# Altium footprint library Generic Footprint.PcbLib: 160 footprints (part 3 of 20)
Each footprint in its own frame and in the unit in brackets; x right, y up, seen from the top. Pads: shape width x height; smd on the part's side, far side on the other; paste and mask are expansions set on the pad; w line width, h text height; cw(c..) or ccw(c..) is an arc to the next point about the centre after c.
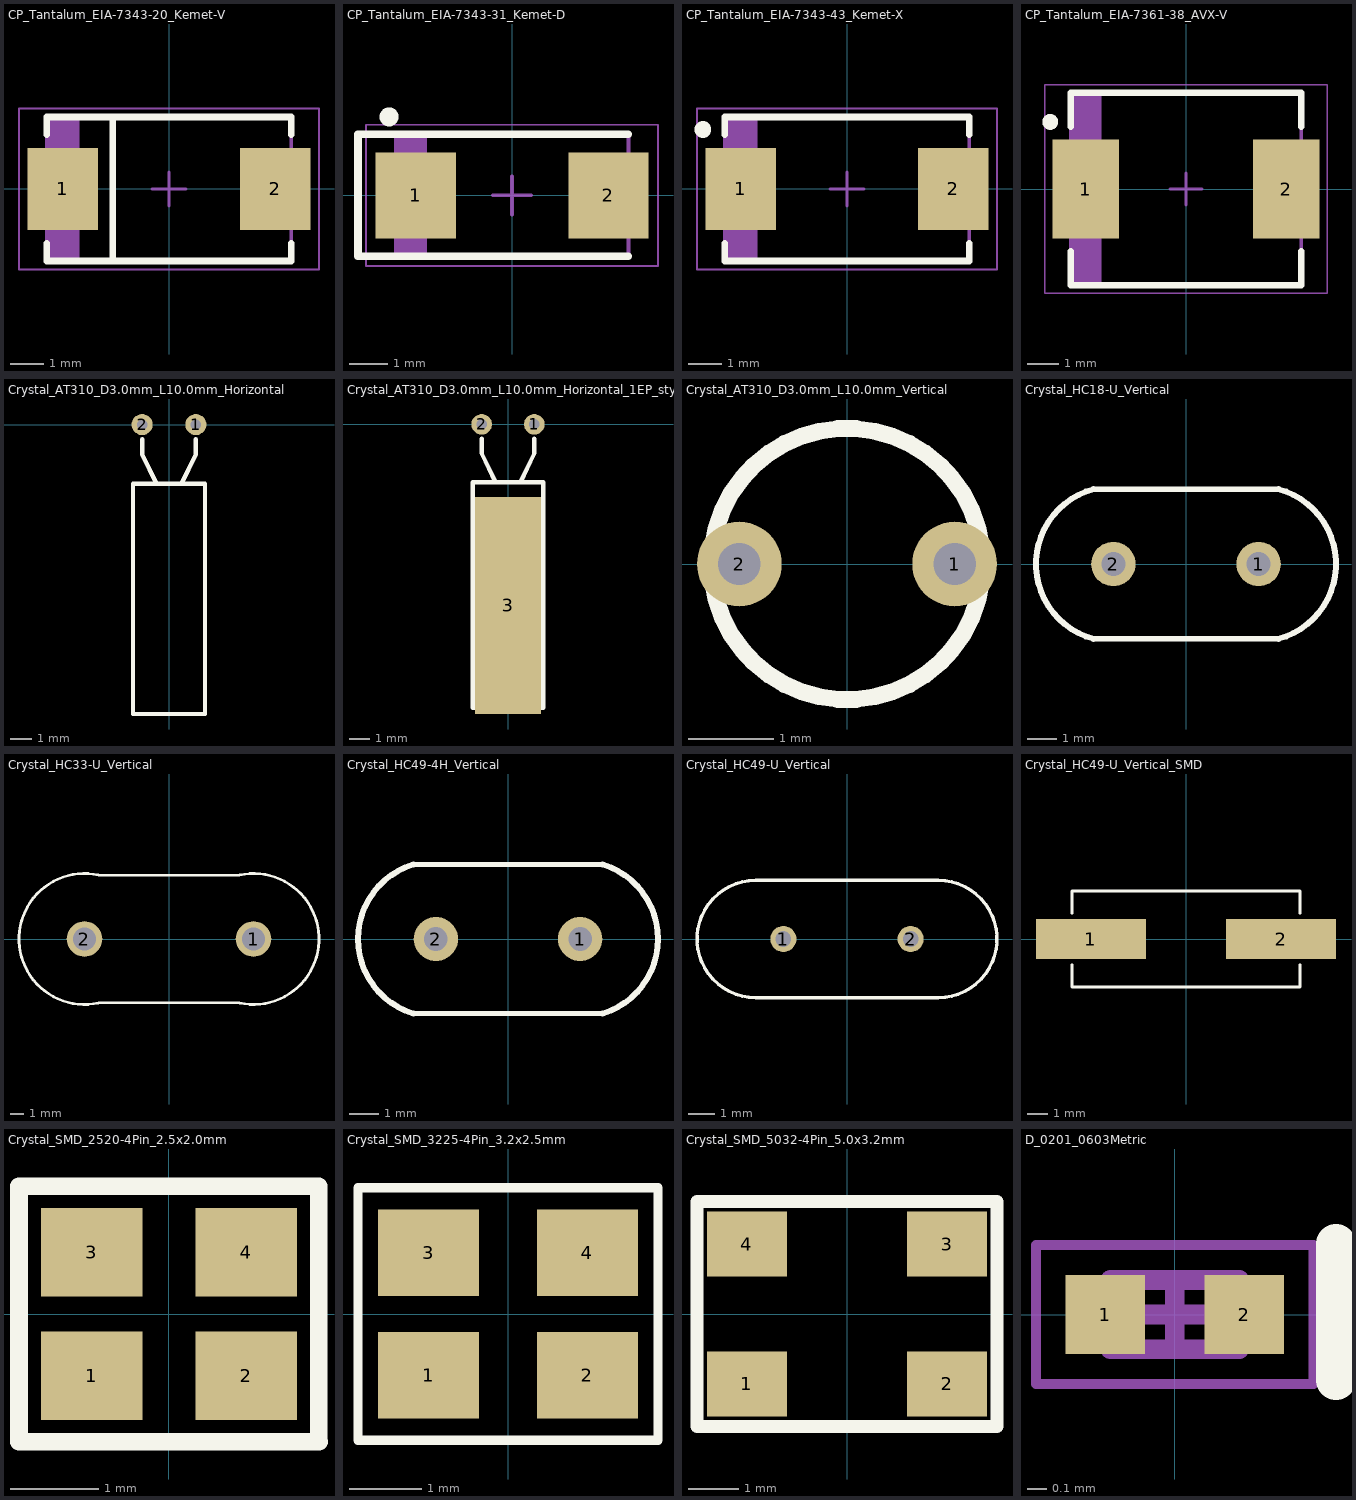
[diagram p2: the footprints below, top view; thin cyan lines are the x and y axes]

## CP_Tantalum_EIA-7343-20_Kemet-V [mm] "Molded Tantalum Capacitor, 2-Leads, Body 7.30x4.30mm, IPC Medium Density"
height 2
pads (2):
  rect 2.1x2.45 smd: 1(-3.175,0) 2(3.175,0)
Top Overlay:
  lines w0.2: -3.65,-1.625 -3.65,-2.15 3.65,-2.15 3.65,-1.625 ; -3.65,1.625 -3.65,2.15 3.65,2.15 3.65,1.625 ; -1.676,-2.108 -1.676,2.108
Courtyard Top:
  lines w0.05: -4.475,-2.4 -4.475,2.4 4.475,2.4 4.475,-2.4 -4.475,-2.4
  lines w0.1: -0.5,0 0.5,0 ; 0,-0.5 0,0.5
Assembly Top:
  rectangle: -3.65,-2.15 -2.668,2.15
  lines w0.1: -3.65,-2.15 -3.65,2.15 3.65,2.15 3.65,-2.15 -3.65,-2.15
3D body "CP_EIA-7343-20_Kemet-V.step": height 2, standoff 0, extent -3.87,-2.15 3.87,2.15

## CP_Tantalum_EIA-7343-31_Kemet-D [mm] "Molded Tantalum Capacitor, 2-Leads, Body 6.00x3.20mm, IPC Medium Density"
height 2.6
pads (2):
  rect 2.1x2.25 smd: 1(-2.525,0) 2(2.525,0)
Top Overlay:
  circle w0.25: c-3.226,2.057 r0.125
  lines w0.2: 3.05,-1.6 -3.05,-1.6 -4.038,-1.6 ; 3.05,1.6 -3.05,1.6 -4.038,1.6 -4.038,-1.6 ; -4.038,-1.6 -4.038,-1.6
Courtyard Top:
  lines w0.05: -3.825,-1.85 3.825,-1.85 3.825,1.85 -3.825,1.85 -3.825,-1.85
  lines w0.1: -0.5,0 0.5,0 ; 0,-0.5 0,0.5
Assembly Top:
  rectangle: -3.05,-1.6 -2.23,1.6
  lines w0.1: -3.05,-1.6 3.05,-1.6 3.05,1.6 -3.05,1.6 -3.05,-1.6
3D body "CP_EIA-7343-31_Kemet-D.step": height 2.6, standoff 0, extent -3.27,-1.6 3.27,1.6

## CP_Tantalum_EIA-7343-43_Kemet-X [mm] "Molded Tantalum Capacitor, 2-Leads, Body 7.30x4.30mm, IPC Medium Density"
height 4.1
pads (2):
  rect 2.1x2.45 smd: 1(-3.175,0) 2(3.175,0)
Top Overlay:
  circle w0.25: c-4.3,1.775 r0.125
  lines w0.2: -3.65,-1.625 -3.65,-2.15 3.65,-2.15 3.65,-1.625 ; -3.65,1.625 -3.65,2.15 3.65,2.15 3.65,1.625
Courtyard Top:
  lines w0.05: -4.475,-2.4 4.475,-2.4 4.475,2.4 -4.475,2.4 -4.475,-2.4
  lines w0.1: -0.5,0 0.5,0 ; 0,-0.5 0,0.5
Assembly Top:
  rectangle: -3.65,-2.15 -2.668,2.15
  lines w0.1: -3.65,-2.15 3.65,-2.15 3.65,2.15 -3.65,2.15 -3.65,-2.15
3D body "CP_Tantalum_EIA-7343-43_Kemet-X.step": height 4.1, standoff 0, extent -3.87,-2.15 3.87,2.15

## CP_Tantalum_EIA-7361-38_AVX-V [mm] "Molded Tantalum Capacitor, 2-Leads, Body 7.30x6.10mm, IPC Medium Density"
height 3.55
pads (2):
  rect 2.1x3.15 smd: 1(-3.175,0) 2(3.175,0)
Top Overlay:
  circle w0.25: c-4.3,2.125 r0.125
  lines w0.2: -3.65,-1.975 -3.65,-3.05 3.65,-3.05 3.65,-1.975 ; -3.65,1.975 -3.65,3.05 3.65,3.05 3.65,1.975
Courtyard Top:
  lines w0.05: -4.475,-3.3 4.475,-3.3 4.475,3.3 -4.475,3.3 -4.475,-3.3
  lines w0.1: -0.5,0 0.5,0 ; 0,-0.5 0,0.5
Assembly Top:
  rectangle: -3.65,-3.05 -2.668,3.05
  lines w0.1: -3.65,-3.05 3.65,-3.05 3.65,3.05 -3.65,3.05 -3.65,-3.05
3D body "CP_EIA-7361-38_AVX-V.step": height 3.55, standoff 0, extent -3.87,-3.05 3.87,3.05

## Crystal_AT310_D3.0mm_L10.0mm_Horizontal [mm]
pads (2):
  round 1 hole 0.5: 1(1.27,0) 2(-1.27,0)
Top Overlay:
  lines w0.203: -1.27,-0.7 -1.27,-1.4 -0.6,-2.8 ; 0.6,-2.8 1.27,-1.4 1.27,-0.7 ; -1.7,-13.7 1.7,-13.7 1.7,-2.8 -1.7,-2.8 -1.7,-13.7

## Crystal_AT310_D3.0mm_L10.0mm_Horizontal_1EP_style1 [mm]
pads (3):
  round 1 hole 0.5: 1(1.27,0) 2(-1.27,0)
  rect 3.2x10.5 smd: 3(0,-8.75)
Top Overlay:
  lines w0.203: -1.27,-0.7 -1.27,-1.4 -0.6,-2.8 ; 0.6,-2.8 1.27,-1.4 1.27,-0.7 ; -1.7,-13.7 -1.7,-2.8 1.7,-2.8 1.7,-13.7 -1.7,-13.7

## Crystal_AT310_D3.0mm_L10.0mm_Vertical [mm]
pads (2):
  round 1 hole 0.5: 1(1.27,0) 2(-1.27,0)
Top Overlay:
  circle w0.2: c0,0 r1.6

## Crystal_HC18-U_Vertical [mm]
pads (2):
  round 1.5 hole 0.8: 1(2.45,0) 2(-2.45,0)
Top Overlay:
  lines w0.178: -3.125,-2.525 3.125,-2.525 ; -3.125,2.525 3.125,2.525
  lines w0.2: -3.125,-2.525 cw(c-2.45,0) -3.125,2.525 ; 3.125,-2.525 ccw(c2.45,0) 3.125,2.525

## Crystal_HC33-U_Vertical [mm]
pads (2):
  round 2.6 hole 1.7: 1(6.17,0) 2(-6.17,0)
Top Overlay:
  lines w0.178: -5.145,-4.67 5.145,-4.67 ; -5.145,4.67 5.145,4.67
  lines w0.2: -5.145,-4.67 cw(c-6.17,0) -5.145,4.67 ; 5.145,-4.67 ccw(c6.17,0) 5.145,4.67

## Crystal_HC49-4H_Vertical [mm]
pads (2):
  round 1.5 hole 0.8: 1(2.44,0) 2(-2.44,0)
Top Overlay:
  lines w0.178: -3.2,-2.525 3.2,-2.525 ; -3.2,2.525 3.2,2.525
  lines w0.2: -3.2,-2.525 cw(c-2.44,0) -3.2,2.525 ; 3.2,-2.525 ccw(c2.44,0) 3.2,2.525

## Crystal_HC49-U_Vertical [mm]
pads (2):
  round 1 hole 0.6: 1(-2.44,0) 2(2.44,0)
Top Overlay:
  lines w0.127: -3.5,-2.25 cw(c-3.5,0) -3.5,2.25 3.5,2.25 cw(c3.5,0) 3.5,-2.25 -3.5,-2.25
3D body "Crystal_HC49-U_Vertical.step": height 3.5, standoff -3, extent -5.75,-2.325 5.75,2.325

## Crystal_HC49-U_Vertical_SMD [mm]
pads (2):
  rect 5.5x2 smd: 1(-4.75,0) 2(4.75,0)
Top Overlay:
  lines w0.127: -5.7,-1.296 -5.7,-2.4 5.7,-2.4 5.7,-1.296 ; -5.7,1.295 -5.7,2.4 5.7,2.4 5.7,1.295
3D body "Crystal_HC49-U_Vertical_SMD.STEP": height 5.1, standoff 0, extent -7.5,-2.25 7.5,2.25

## Crystal_SMD_2520-4Pin_2.5x2.0mm [mm]
pads (4):
  rect 1.15x1 smd: 1(-0.875,-0.7) 2(0.875,-0.7) 3(-0.875,0.7) 4(0.875,0.7)
Top Overlay:
  lines w0.2: 1.7,-1.45 1.7,1.45 -1.7,1.45 -1.7,-1.45 1.702,-1.45

## Crystal_SMD_3225-4Pin_3.2x2.5mm [mm]
pads (4):
  rect 1.4x1.2 smd: 1(-1.1,-0.85) 2(1.1,-0.85) 3(-1.1,0.85) 4(1.1,0.85)
Top Overlay:
  lines w0.127: -2.08,-1.75 -2.08,1.75 2.08,1.75 2.08,-1.75 -2.08,-1.75
3D body "Crystal_SMD_3225-4Pin_3.2x2.5mm.step": height 0.81, standoff 0, extent -1.6,-1.25 1.6,1.25
3D body: height 5.38, standoff -3.17, extent -0.102,1.372 -0.102,1.372

## Crystal_SMD_5032-4Pin_5.0x3.2mm [mm]
pads (4):
  rect 1.6x1.3 smd: 1(-2,-1.4) 2(2,-1.4) 3(2,1.4) 4(-2,1.4)
Top Overlay:
  lines w0.254: -3,-2.25 3,-2.25 3,2.25 -3,2.25 -3,-2.25

## D_0201_0603Metric [mm]
height 0.25
pads (2):
  rect 0.4x0.4 smd: 1(-0.35,0) 2(0.35,0)
Top Overlay:
  lines w0.2: 0.813,-0.33 0.813,0.356
Courtyard Top:
  lines w0.05: -0.7,-0.35 -0.7,0.35 0.7,0.35 0.7,-0.35 -0.7,-0.35
  lines w0.1: -0.175,0 0.175,0 ; 0,-0.175 0,0.175
Assembly Top:
  lines w0.1: -0.325,-0.175 -0.325,0.175 0.325,0.175 0.325,-0.175 -0.325,-0.175
3D body "D_0201_0603Metric.step": height 0.25, standoff 0, extent -0.325,-0.175 0.325,0.175